# Altium footprint library NDLib.PCBLIB: 499 footprints (part 29 of 32)
Each footprint in its own frame and in the unit in brackets; x right, y up, seen from the top. Pads: shape width x height; smd on the part's side, far side on the other; paste and mask are expansions set on the pad; w line width, h text height; cw(c..) or ccw(c..) is an arc to the next point about the centre after c.
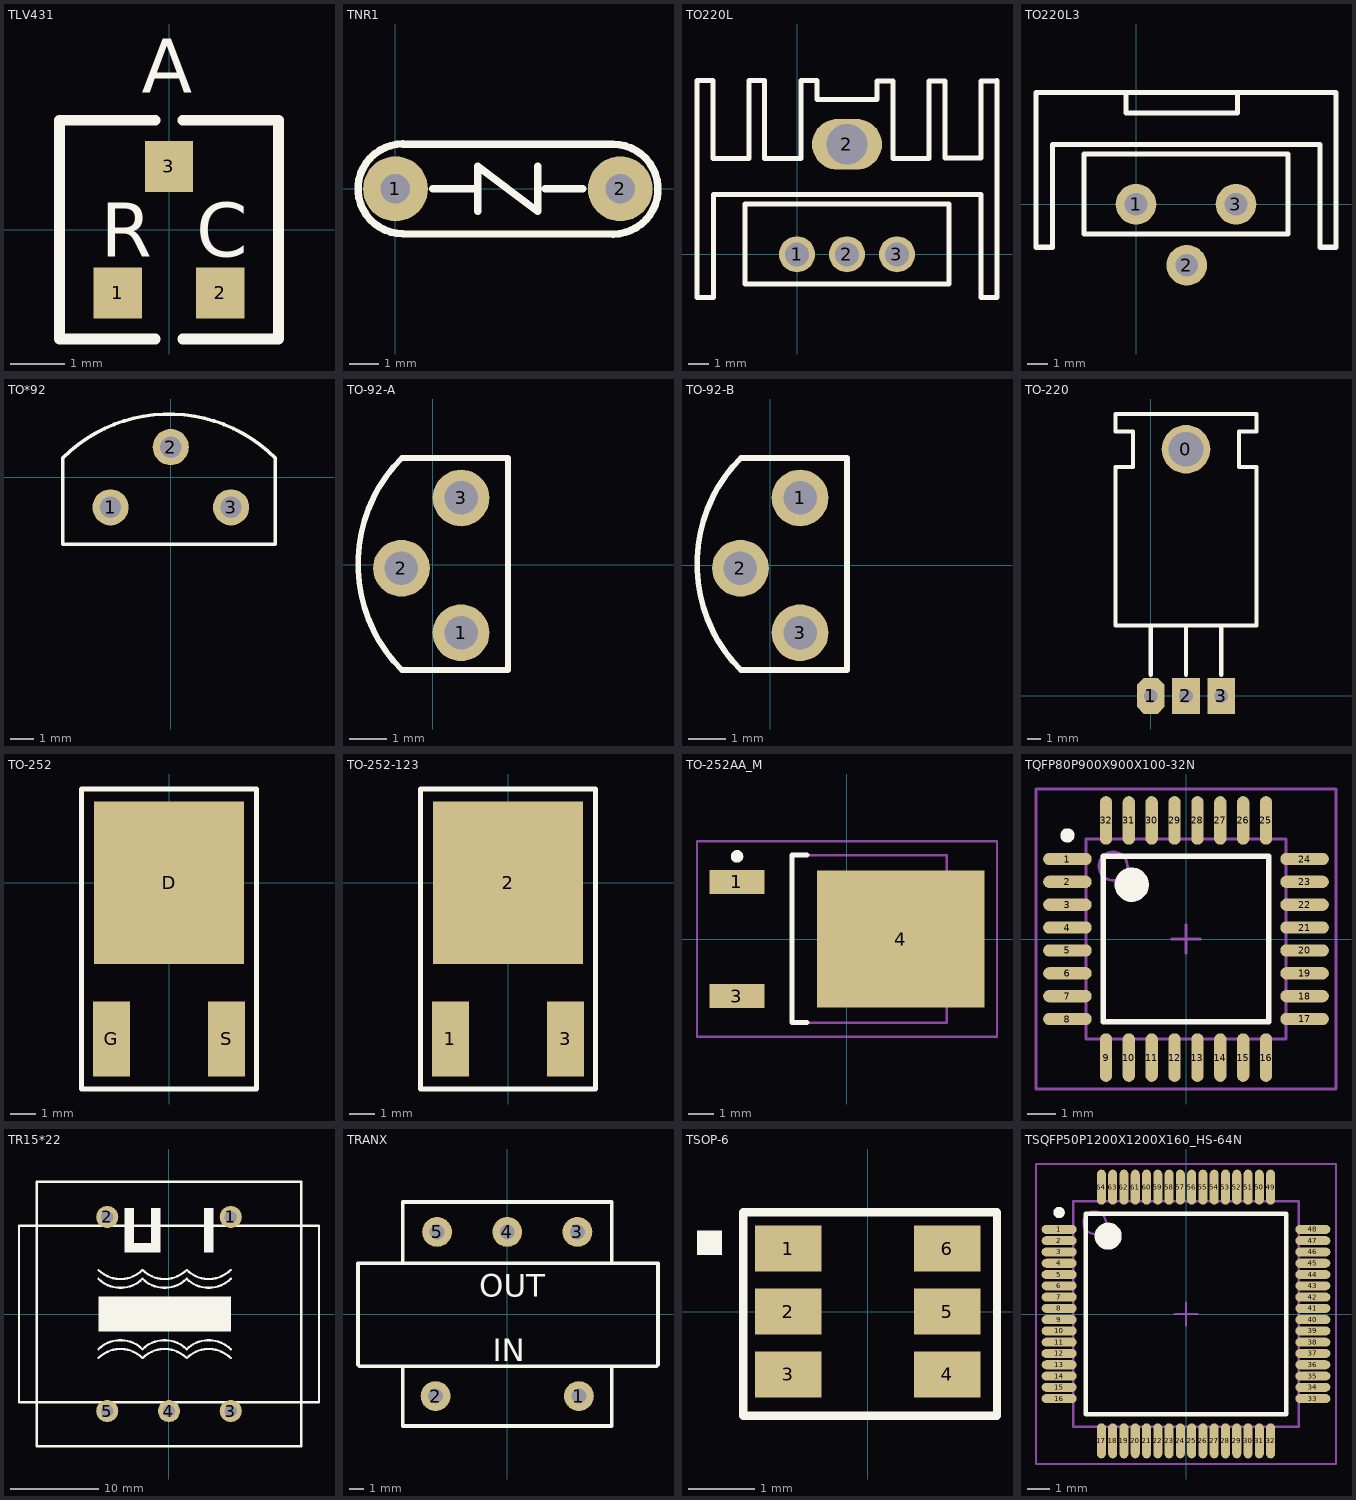
[diagram p28: the footprints below, top view; thin cyan lines are the x and y axes]

## TLV431 [mm]
pads (3):
  rect 0.9x0.95 smd: 1(-0.95,-1.175) 2(0.95,-1.175) 3(0,1.175)
TopOverlay:
  lines w0.2: -2.032,-0.3 -2.032,2.032 -0.254,2.032 ; -2.032,0.3 -2.032,-2.032 -0.254,-2.032 ; 0.254,-2.032 2.032,-2.032 2.032,0.3 ; 0.254,2.032 2.032,2.032 2.032,-0.3
  text "C" at 0.508,-0.508 h1
  text "R" at -1.27,-0.508 h1
  text "A" at -0.508,2.54 h1

## TNR1 [mm]
pads (2):
  round 2.2 hole 1: 1(0,0) 2(7.62,0)
TopOverlay:
  lines w0.254: 0.254,1.514 7.374,1.514 cw(c7.374,-0.01) 7.374,-1.534 0.254,-1.524 cw(c0.254,0) 0.254,1.524 ; 1.27,0 2.794,0 ; 2.794,-0.762 2.794,0.762 4.826,-0.762 4.826,0.762 ; 5.08,0 6.35,0

## TO220L [mm]
pads (4):
  round 1.8 / inner round 1.8 / far side oval 1.8x3 hole 1.2: 1(-0.007,0.005) 2(2.493,0.005) 3(4.993,0.005)
  oval 3.5x2.54 hole 2.032: 2(2.493,5.505)
TopOverlay:
  lines w0.254: -5.007,8.665 -5.007,-2.145 -4.187,-2.145 -4.187,-2.105 ; -5.007,8.685 -4.207,8.685 -4.207,4.805 -2.417,4.805 -2.417,8.685 -1.627,8.685 -1.627,4.805 0.183,4.805 0.183,8.685 0.993,8.685 0.993,7.755 4.003,7.755 4.003,8.665 4.783,8.665 4.783,4.805 6.593,4.805 6.593,8.675 7.383,8.675 7.383,4.815 9.183,4.815 9.183,8.665 9.983,8.665 ; -4.187,-2.115 -4.187,2.995 9.193,2.995 9.193,-2.145 9.993,-2.145 9.993,8.685 ; -2.607,2.525 7.593,2.525 7.593,-1.485 -2.597,-1.485 -2.597,2.515

## TO220L3 [mil]
pads (3):
  round 80 hole 45: 1(0,0) 2(100,-120) 3(196.85,0)
TopOverlay:
  lines w10: -164.57,-83.47 -164.57,117.72 362.2,117.72 362.2,-84.65 393.7,-84.65 393.7,220 -196.85,220 -196.85,-84.65 -164.57,-84.65 -164.57,-83.07 ; -102.36,99.21 299.21,99.21 299.21,-58.66 -101.97,-58.66 -101.97,98.82 ; -20,220 -20,180 200,180 200,220

## TO*92 [mil]
height 200
pads (3):
  round 60 hole 35.43: 1(-100,-50) 2(0,50) 3(100,-50)
TopOverlay:
  lines w6: -179,-111 173,-111 173,32 ccw(c-3,-144) -179,32 -179,-111

## TO-92-A [mil]
height 275.59
pads (3):
  round 60 hole 35.43: 1(29.85,-72.06) 2(-33.22,-3.69) 3(29.85,70.66)
TopOverlay:
  lines w6: -32.73,-111.47 cw(c79.48,0.74) -32.73,112.94 79.48,112.94 79.48,-111.47 -32.73,-111.47

## TO-92-B [mil]
height 275.59
pads (3):
  round 60 hole 35.43: 1(31.54,71.36) 2(-31.54,-2.99) 3(31.54,-71.36)
TopOverlay:
  lines w6: -31.04,-110.77 cw(c81.16,1.44) -31.04,113.64 81.16,113.64 81.16,-110.77 -31.04,-110.77

## TO-220 [mm]
pads (4):
  round 3.5 hole 2.5: 0(2.54,17.78)
  oct 2x2.6 hole 1: 1(0,0)
  rect 2x2.575 hole 1: 2(2.54,0) 3(5.08,0)
TopOverlay:
  lines w0.305: 0,1.524 0,5.08 ; 2.54,1.524 2.54,5.08 ; 5.08,1.524 5.08,5.08 ; -2.54,5.08 -2.54,16.51 -1.27,16.51 -1.27,19.05 -2.54,19.05 -2.54,20.32 7.62,20.32 7.62,19.05 6.35,19.05 6.35,16.51 7.62,16.51 7.62,5.08 -2.54,5.08

## TO-252 [mm]
height 6
pads (3):
  rect 6x6.5 smd: D(0,0)
  rect 1.5x3 smd: G(-2.3,-6.25) S(2.3,-6.25)
TopOverlay:
  lines w0.2: -3.5,-8.25 -3.5,3.75 3.5,3.75 3.5,-8.25 -3.5,-8.25

## TO-252-123 [mm]
height 6
pads (3):
  rect 1.5x3 smd: 1(-2.3,-6.25) 3(2.3,-6.25)
  rect 6x6.5 smd: 2(0,0)
TopOverlay:
  lines w0.2: -3.5,-8.25 -3.5,3.75 3.5,3.75 3.5,-8.25 -3.5,-8.25

## TO-252AA_M [mm] "D-PAK, 4-Leads, Body 6.1x6.5mm, Pitch 2.28mm, Lead Span 9.8mm, IPC Low Density"
height 2.38
pads (3):
  rect 2.2x0.95 smd: 1(-4.4,2.28) 3(-4.4,-2.28)
  rect 6.7x5.5 smd: 4(2.15,0)
TopOverlay:
  circle w0.25: c-4.4,3.305 r0.125
  lines w0.2: -1.6,-3.35 -2.2,-3.35 -2.2,3.35 -1.6,3.35
Mechanical13:
  lines w0.1: -2.2,-3.35 4,-3.35 4,3.35 -2.2,3.35 -2.2,-3.35
Mechanical15:
  lines w0.1: -0.5,0 0.5,0 ; 0,-0.5 0,0.5 ; -6,-3.9 6,-3.9 6,3.9 -6,3.9 -6,-3.9
3D body: height 2.39, standoff -0.02, extent -4.9,-3.27 5.038,3.27

## TQFP80P900X900X100-32N [mm] "TQFP, 32-Leads, Body 9.2x9.2mm (max), Pitch 0.80mm, IPC Medium Density"
height 1
pads (32):
  oval 1.7x0.432 smd: 1(-4.15,2.8) 2(-4.15,2) 3(-4.15,1.2) 4(-4.15,0.4) 5(-4.15,-0.4) 6(-4.15,-1.2) 7(-4.15,-2) 8(-4.15,-2.8) 17(4.15,-2.8) 18(4.15,-2) 19(4.15,-1.2) 20(4.15,-0.4) 21(4.15,0.4) 22(4.15,1.2) 23(4.15,2) 24(4.15,2.8)
  oval 0.432x1.7 smd: 9(-2.8,-4.15) 10(-2,-4.15) 11(-1.2,-4.15) 12(-0.4,-4.15) 13(0.4,-4.15) 14(1.2,-4.15) 15(2,-4.15) 16(2.8,-4.15) 25(2.8,4.15) 26(2,4.15) 27(1.2,4.15) 28(0.4,4.15) 29(-0.4,4.15) 30(-1.2,4.15) 31(-2,4.15) 32(-2.8,4.15)
TopOverlay:
  circle w0.6: c-1.9,1.9 r0.3
  circle w0.25: c-4.15,3.625 r0.125
  lines w0.2: -2.9,-2.9 2.9,-2.9 2.9,2.9 -2.9,2.9 -2.9,-2.9
Mechanical13:
  circle w0.1: c-2.55,2.55 r0.5
  lines w0.1: -3.5,-3.5 3.5,-3.5 3.5,3.5 -3.5,3.5 -3.5,-3.5
Mechanical15:
  lines w0.1: -0.5,0 0.5,0 ; 0,-0.5 0,0.5 ; -5.25,-5.25 5.25,-5.25 5.25,5.25 -5.25,5.25 -5.25,-5.25
3D body: height 1.2, standoff 1, extent -3.5,-3.5 3.5,3.5

## TR15*22 [mm]
pads (5):
  round 2.5 hole 1.4: 1(7,11) 2(-7,11) 3(7,-11) 4(0,-11) 5(-7,-11)
TopOverlay:
  region: -8,2 -8,-2 7,-2 7,2
  region: 5,7 5,12 4,12 4,7
  region: -1,7 -1,12 -2,12 -2,8 -4,8 -4,12 -5,12 -5,7
  lines w0.254: -8,-5 cw(c-5.5,-7.5) -3,-5 cw(c-0.5,-7.5) 2,-5 cw(c4.5,-7.5) 7,-5 ; -8,-4 cw(c-5.5,-6.5) -3,-4 cw(c-0.5,-6.5) 2,-4 cw(c4.5,-6.5) 7,-4 ; -8,4 ccw(c-5.5,6.5) -3,4 ccw(c-0.5,6.5) 2,4 ccw(c4.5,6.5) 7,4 ; -8,5 ccw(c-5.5,7.5) -3,5 ccw(c-0.5,7.5) 2,5 ccw(c4.5,7.5) 7,5 ; -17,-10 -17,10 17,10 17,-10 -17,-10 ; -15,-15 -15,15 15,15 15,-15 -15,-15

## TRANX [mm]
pads (5):
  round 2 hole 1: 1(4.8,-5.5) 2(-4.8,-5.5) 3(4.7,5.5) 4(0,5.5) 5(-4.7,5.5)
TopOverlay:
  lines w0.254: -7,-3.5 7,-3.5 ; -7,-3.5 -9.9,-3.5 -10,-3.4 -10,3.4 -7,3.4 ; -7,-3.5 -7,-7.5 7,-7.5 7,-3.5 ; -7,3.4 7,3.4 ; -7,3.4 -7,7.5 7,7.5 7,3.4 ; 7,-3.5 10,-3.5 10.1,-3.4 10.1,3.4 7,3.4
  text "OUT" at -1.875,1.15 h1.52
  text "IN" at -0.975,-3.15 h1.52

## TSOP-6 [mm]
pads (6):
  rect 1x0.7 smd: 1(-1.2,0.95) 2(-1.2,0) 3(-1.2,-0.95) 4(1.2,-0.95) 5(1.2,0) 6(1.2,0.95)
TopOverlay:
  rectangle: -2.575,0.85 -2.2,1.225
  lines w0.127: -1.875,-1.575 1.95,-1.575 1.95,1.5 -1.85,1.5 -1.875,1.5 -1.875,-1.575

## TSQFP50P1200X1200X160_HS-64N [mm] "TSQFP, 64-Leads, Body 12.0x12.0mm (max), Pitch 0.50mm, IPC Medium Density"
height 1.6
pads (64):
  oval 1.55x0.4 smd: 1(-5.625,3.75) 2(-5.625,3.25) 3(-5.625,2.75) 4(-5.625,2.25) 5(-5.625,1.75) 6(-5.625,1.25) 7(-5.625,0.75) 8(-5.625,0.25) 9(-5.625,-0.25) 10(-5.625,-0.75) 11(-5.625,-1.25) 12(-5.625,-1.75) 13(-5.625,-2.25) 14(-5.625,-2.75) 15(-5.625,-3.25) 16(-5.625,-3.75) 33(5.625,-3.75) 34(5.625,-3.25) 35(5.625,-2.75) 36(5.625,-2.25) 37(5.625,-1.75) 38(5.625,-1.25) 39(5.625,-0.75) 40(5.625,-0.25) 41(5.625,0.25) 42(5.625,0.75) 43(5.625,1.25) 44(5.625,1.75) 45(5.625,2.25) 46(5.625,2.75) 47(5.625,3.25) 48(5.625,3.75)
  oval 0.4x1.55 smd: 17(-3.75,-5.625) 18(-3.25,-5.625) 19(-2.75,-5.625) 20(-2.25,-5.625) 21(-1.75,-5.625) 22(-1.25,-5.625) 23(-0.75,-5.625) 24(-0.25,-5.625) 25(0.25,-5.625) 26(0.75,-5.625) 27(1.25,-5.625) 28(1.75,-5.625) 29(2.25,-5.625) 30(2.75,-5.625) 31(3.25,-5.625) 32(3.75,-5.625) 49(3.75,5.625) 50(3.25,5.625) 51(2.75,5.625) 52(2.25,5.625) 53(1.75,5.625) 54(1.25,5.625) 55(0.75,5.625) 56(0.25,5.625) 57(-0.25,5.625) 58(-0.75,5.625) 59(-1.25,5.625) 60(-1.75,5.625) 61(-2.25,5.625) 62(-2.75,5.625) 63(-3.25,5.625) 64(-3.75,5.625)
TopOverlay:
  circle w0.25: c-5.625,4.5 r0.125
  circle w0.6: c-3.45,3.45 r0.3
  lines w0.2: -4.45,-4.45 -4.45,4.45 4.45,4.45 4.45,-4.45 -4.45,-4.45
Mechanical13:
  circle w0.1: c-4.05,4.05 r0.5
  lines w0.1: -5,-5 -5,5 5,5 5,-5 -5,-5
Mechanical15:
  lines w0.1: -0.5,0 0.5,0 ; 0,-0.5 0,0.5 ; -6.65,-6.65 -6.65,6.65 6.65,6.65 6.65,-6.65 -6.65,-6.65
3D body: height 1.6, standoff 0.15, extent -5,-5 5,5